# Altium footprint library ALL.PcbLib: 385 footprints (part 3 of 25)
Each footprint in its own frame and in the unit in brackets; x right, y up, seen from the top. Pads: shape width x height; smd on the part's side, far side on the other; paste and mask are expansions set on the pad; w line width, h text height; cw(c..) or ccw(c..) is an arc to the next point about the centre after c.
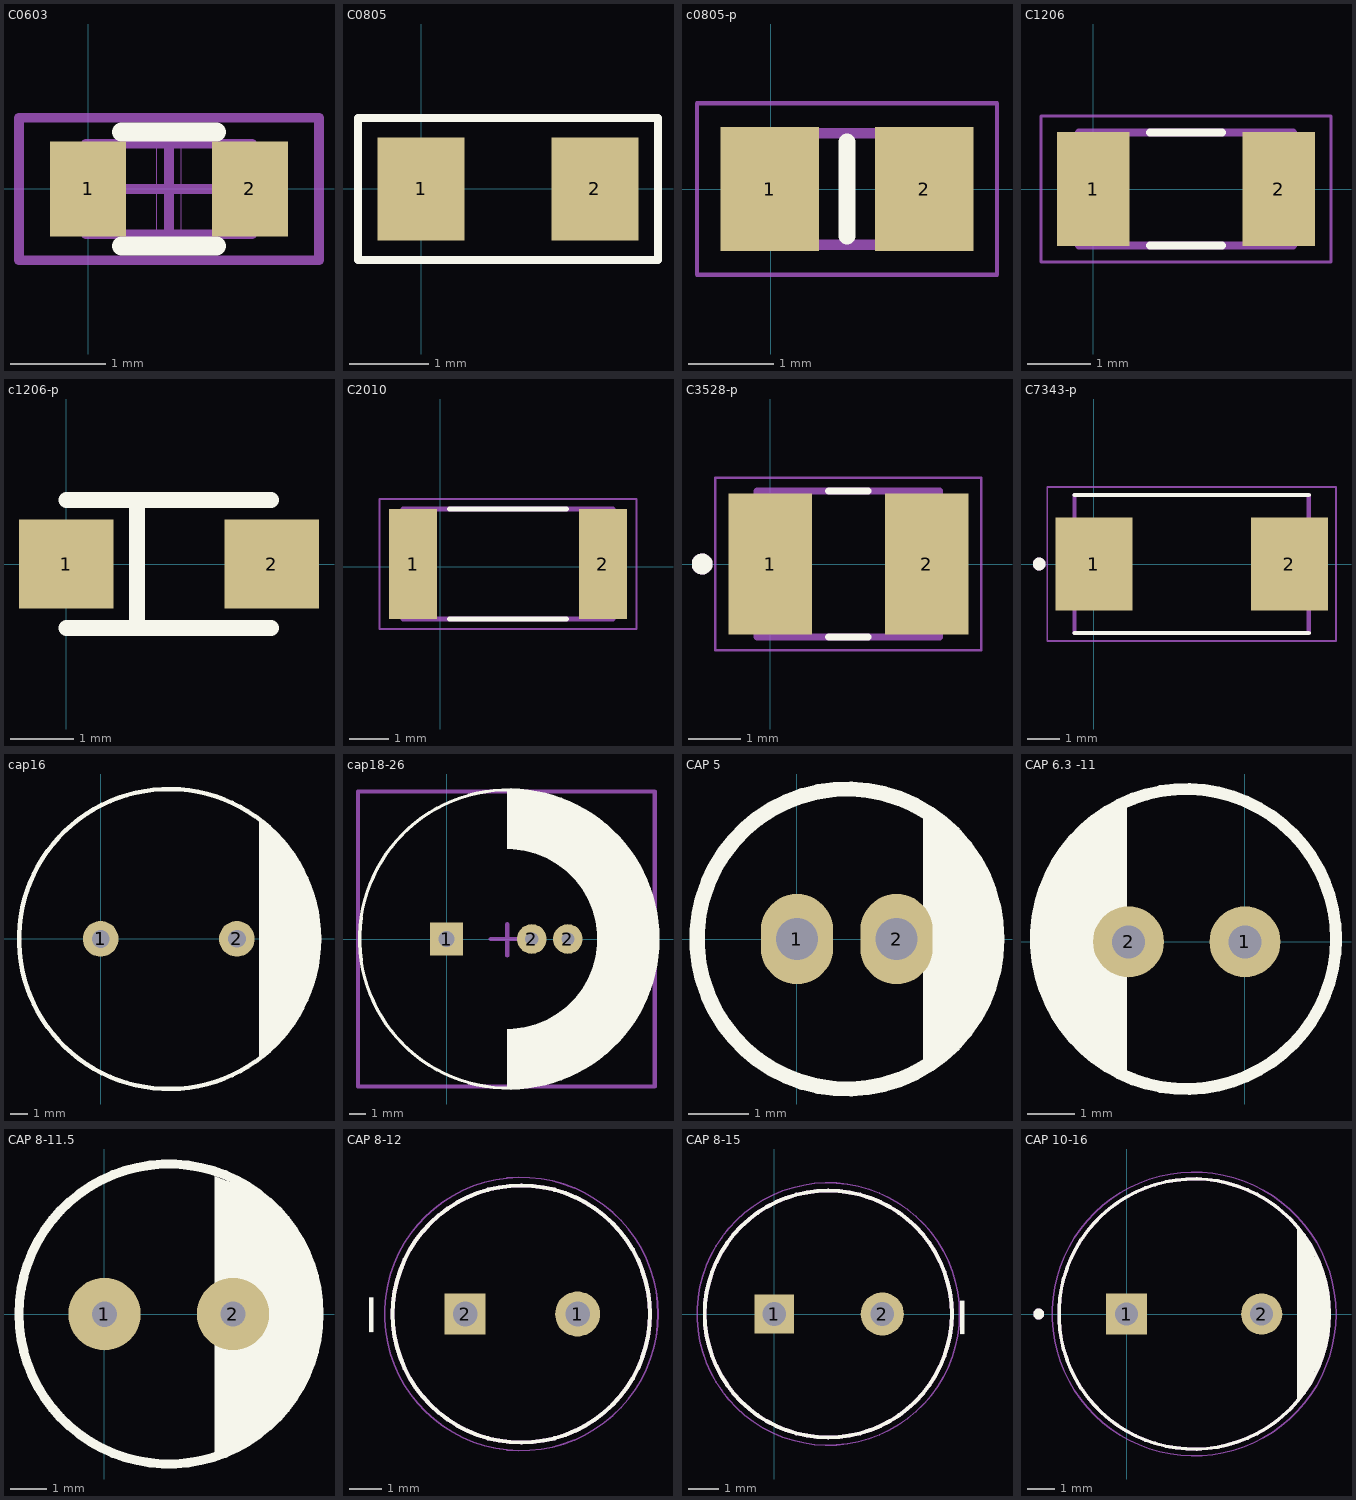
[diagram p2: the footprints below, top view; thin cyan lines are the x and y axes]

## C0603 [mm]
pads (2):
  rect 0.8x1 smd: 1(0,0) 2(1.7,0)
Top Overlay:
  lines w0.2: 0.35,-0.6 1.35,-0.6 ; 0.35,0.6 1.35,0.6
Mechanical 10:
  lines w0.01: 0.723,-0.508 0.723,0.508 0.977,0.508 0.977,-0.533 0.952,-0.508 0.723,-0.508
Mechanical 13:
  lines w0.1: -0.025,-0.475 -0.025,0.475 1.725,0.475 1.725,-0.475 -0.025,-0.475
Mechanical 15:
  lines w0.1: 0.375,0 1.325,0 ; 0.85,-0.475 0.85,0.475 ; -0.725,-0.75 -0.725,0.75 2.425,0.75 2.425,-0.75 -0.725,-0.75
3D body "LD033C223JAB2A.STEP": height 0.9, standoff 0, extent 0.089,-0.405 1.689,0.405

## C0805 [mm]
pads (2):
  rect 1.1x1.3 smd: 1(0,0) 2(2.2,0)
Top Overlay:
  lines w0.1: -0.8,-0.9 3,-0.9 3,0.9 -0.8,0.9 -0.8,0 -0.8,-0.9
3D body "0805 SMD Capacitor.STEP": height 0.78, standoff 0, extent 0.094,-0.625 2.094,0.625

## c0805-p [mm]
pads (2):
  rect 1.15x1.45 smd: 1(-0.011,0) 2(1.789,0)
Top Overlay:
  lines w0.2: 0.889,-0.55 0.889,0.55
Mechanical 13:
  region: 1.889,-0.65 1.389,-0.65 1.389,0.65 1.889,0.65
  region: 0.389,-0.65 -0.111,-0.65 -0.111,0.65 0.389,0.65
  lines w0.127: -0.111,-0.65 -0.111,0.65 1.889,0.65 1.889,-0.65 -0.111,-0.65
Mechanical 15:
  lines w0.05: -0.861,-1 -0.861,1 2.639,1 2.639,-1 -0.861,-1
3D body "TCJR475M010S0500.STEP": height 1.2, standoff 0, extent -0.187,-0.574 1.863,0.726

## C1206 [mm]
pads (2):
  rect 1.16x1.82 smd: 1(0,0) 2(2.95,0)
Top Overlay:
  lines w0.127: 0.905,-0.9 2.045,-0.9 ; 0.905,0.9 2.045,0.9
Mechanical 13:
  lines w0.127: -0.225,-0.9 -0.225,0.9 3.175,0.9 3.175,-0.9 -0.225,-0.9
Mechanical 15:
  lines w0.05: -0.833,-1.158 -0.833,1.158 3.783,1.158 3.783,-1.158 -0.833,-1.158
3D body "C1206C224K3REC (1).STEP": height 1, standoff 0, extent -0.049,-0.851 3.151,0.749

## c1206-p [mm]
pads (2):
  rect 1.5x1.42 smd: 1(0,0) 2(3.26,0)
Top Overlay:
  lines w0.254: 0,-1.016 3.25,-1.016 ; 0,1.016 3.25,1.016 ; 1.122,-1.016 1.122,1.016
3D body "A Case SMT Capacitor.STEP": height 1.77, standoff 0.17, extent -0.007,-0.8 3.167,0.8

## C2010 [mm]
pads (2):
  rect 1.21x2.8 smd: 1(-0.689,0.076) 2(4.143,0.076)
Top Overlay:
  lines w0.127: 0.237,-1.324 3.217,-1.324 ; 0.237,1.476 3.217,1.476
Mechanical 13:
  lines w0.127: -0.943,-1.324 -0.943,1.476 4.397,1.476 4.397,-1.324 -0.943,-1.324
Mechanical 15:
  lines w0.05: -1.544,-1.575 -1.544,1.727 4.998,1.727 4.998,-1.575 -1.544,-1.575
3D body "3-1879464-1.stp": height 0.55, standoff -0.05, extent -0.849,-1.174 4.151,1.326

## C3528-p [mm]
pads (2):
  rect 1.6x2.7 smd: 1(0,0) 2(3,0)
Top Overlay:
  circle w0.2: c-1.3,0 r0.1
  lines w0.127: 1.12,-1.4 1.88,-1.4 ; 1.12,1.4 1.88,1.4
Mechanical 13:
  circle w0.2: c-1.3,0 r0.1
  lines w0.127: -0.25,-1.4 3.25,-1.4 3.25,1.4 -0.25,1.4 -0.25,-1.4
Mechanical 15:
  lines w0.05: -1.05,-1.65 4.05,-1.65 4.05,1.65 -1.05,1.65 -1.05,-1.65
3D body "User Library-AVX_BCASE.STEP": height 2.03, standoff 0, extent -0.453,-1.465 3.247,1.465

## C7343-p [mm]
pads (2):
  rect 2.4x2.9 smd: 1(0,0) 2(6.1,0)
Top Overlay:
  circle w0.2: c-1.7,0 r0.1
  lines w0.127: -0.6,-2.15 6.7,-2.15 ; -0.6,2.15 6.7,2.15
Mechanical 13:
  circle w0.2: c-1.7,0 r0.1
  lines w0.127: -0.6,-2.15 -0.6,2.15 6.7,2.15 6.7,-2.15 -0.6,-2.15
Mechanical 15:
  lines w0.05: -1.45,-2.4 -1.45,2.4 7.55,2.4 7.55,-2.4 -1.45,-2.4
3D body "User Library-CAP_TANT_7343-40.STEP": height 4, standoff 0, extent -0.752,-2.3 6.848,2.3

## cap16 [mm]
pads (2):
  round 2 hole 1: 1(0,0) 2(7.643,0.002)
Top Overlay:
  circle w0.254: c3.833,-0.009 r8.416
  region: 8.901,6.859 8.901,-6.603 10.425,-5.333 11.441,-3.809 12.203,-1.015 12.203,1.525 11.441,3.811 10.171,5.589
3D body "User Library-CE_R300_D650_H1000.STEP": height 26.4, standoff -2.5, extent -4.409,-8.245 12.074,8.216

## cap18-26 [mm]
pads (3):
  rect 2x2 hole 1: 1(0,0)
  round 1.8 hole 0.8: 2(5.2,0) 2(7.4,0)
Top Overlay:
  circle w0.2: c3.796,0 r9.1
  region: 3.7,9.1 3.796,9.1 4.243,9.1 5.133,9.012 6.01,8.838 6.865,8.578 7.691,8.236 8.48,7.815 9.223,7.318 9.915,6.751 10.547,6.119 11.114,5.427 11.611,4.684 12.032,3.895 12.374,3.069 12.634,2.214 12.808,1.337 12.896,0.447 12.896,0 12.896,-0.447 12.808,-1.337 12.634,-2.214 12.374,-3.069 12.032,-3.895 11.611,-4.684 11.114,-5.427 10.547,-6.119 9.915,-6.751 9.223,-7.318 8.48,-7.815 7.691,-8.236 6.865,-8.578 6.01,-8.838 5.133,-9.012 4.243,-9.1 3.796,-9.1 3.7,-9.1 3.7,-5.5 4.06,-5.488 4.773,-5.394 5.468,-5.208 6.133,-4.933 6.756,-4.573 7.326,-4.135 7.835,-3.626 8.273,-3.056 8.633,-2.433 8.908,-1.768 9.094,-1.073 9.188,-0.36 9.2,0 9.188,0.36 9.094,1.073 8.908,1.768 8.633,2.433 8.273,3.056 7.835,3.626 7.326,4.135 6.756,4.573 6.133,4.933 5.468,5.208 4.773,5.394 4.06,5.488 3.7,5.5
Mechanical 15:
  lines w0.254: 2.7,0 4.7,0 ; 3.7,-1 3.7,0.9 ; -5.4,-9 -5.4,9 12.7,9 12.7,-9 -5.4,-9
3D body "User Library-Cap-EL(18x26-7_5)T.STEP": height 27, standoff -3, extent -5.3,-8.999 12.702,8.999

## CAP 5 [mm]
pads (2):
  oval 1.2x1.5 hole 0.7: 1(0,0) 2(1.654,0)
Top Overlay:
  circle w0.254: c0.83,0.001 r2.491
  region: 2.097,-2.032 2.097,2.032 2.605,1.778 3.113,1.27 3.322,0.001 2.859,-1.524
3D body "User Library-CE_R200_D200_H460.STEP": height 11.7, standoff -4.9, extent -1.913,-2.6 3.667,2.479

## CAP 6.3 -11 [mm]
pads (2):
  round 1.5 hole 0.7: 1(0,0) 2(-2.462,0)
Top Overlay:
  circle w0.254: c-1.247,0.06 r3.171
  region: -2.501,3.085 -2.501,-2.757 -3.263,-2.503 -4.025,-1.487 -4.418,0.06 -4.025,1.815
3D body "SW3dPS-Cap electro 6.3x11x2.5mm.STEP": height 11.53, standoff -3.01, extent -4.416,-3.16 1.934,3.191

## CAP 8-11.5 [mm]
pads (2):
  round 2 hole 0.7: 1(0,0) 2(3.549,0.002)
Top Overlay:
  circle w0.254: c1.782,0.002 r4.142
  region: 3.045,3.811 4.315,3.303 5.331,2.033 5.839,0.509 5.839,-0.761 5.331,-2.031 4.061,-3.555 3.045,-4.063
3D body "SW3dPS-Cap electro 8x11.5x3.5mm.STEP": height 12.03, standoff -3.48, extent -2.246,-3.974 5.805,4.076

## CAP 8-12 [mil]
pads (2):
  round 55 hole 30: 1(-377.2,-345)
  rect 50x50 hole 30: 2(-515,-345)
Top Overlay:
  circle w5: c-446.1,-345 r157.48
  text "_" at -645.99,-367 h60
Mechanical 13:
  circle w5: c-446.1,-345 r157.48
Mechanical 15:
  circle w1.97: c-446.1,-345 r167.32
3D body "CircuitWorks-ELECTROLITIC CAPACITOR RADIAL 8X12.STEP": height 472.44, standoff -98.43, extent -607.48,-502.48 -292.52,-187.52

## CAP 8-15 [mil]
pads (2):
  rect 50x50 hole 30: 1(0,0)
  round 55 hole 30: 2(137.8,0)
Top Overlay:
  circle w5: c68.9,0 r157.48
  text "_" at 224,-25 h60
Mechanical 13:
  circle w5: c68.9,0 r157.48
Mechanical 15:
  circle w1.97: c68.9,0 r167.32
3D body "step_temp.STEP": height 590.55, standoff -669.29, extent -88.58,-157.37 226.39,157.39

## CAP 10-16 [mil]
pads (2):
  rect 60x60 hole 33.46: 1(0,0)
  round 60 hole 33.46: 2(196.85,0)
Top Overlay:
  circle w7.87: c-127.95,0 r3.94
  circle w5: c98.43,0 r196.85
  lines w5.91: 251,-122 251,123 ; 255,-117 255,115 ; 259,-110 259,109 ; 262,107 263,106 263,-105 ; 267,-98 267,97 ; 270,90 271,89 271,-92 ; 276,-81 276,81 ; 280,-73 280,72 ; 282,-60 284,-58 284,59 ; 287,47 289,45 289,-47 ; 290,-26 292,-24 292,16
Mechanical 13:
  circle w7.87: c-127.95,0 r3.94
  circle w5: c98.43,0 r196.85
Mechanical 15:
  circle w1.97: c98.43,0 r206.69
3D body "EEU-EB1V331.STEP": height 629.92, standoff -669.29, extent -93.84,-197.82 299.86,195.83